# Altium footprint library Gate Driver Board.PcbLib: 117 footprints (part 3 of 8)
Each footprint in its own frame and in the unit in brackets; x right, y up, seen from the top. Pads: shape width x height; smd on the part's side, far side on the other; paste and mask are expansions set on the pad; w line width, h text height; cw(c..) or ccw(c..) is an arc to the next point about the centre after c.
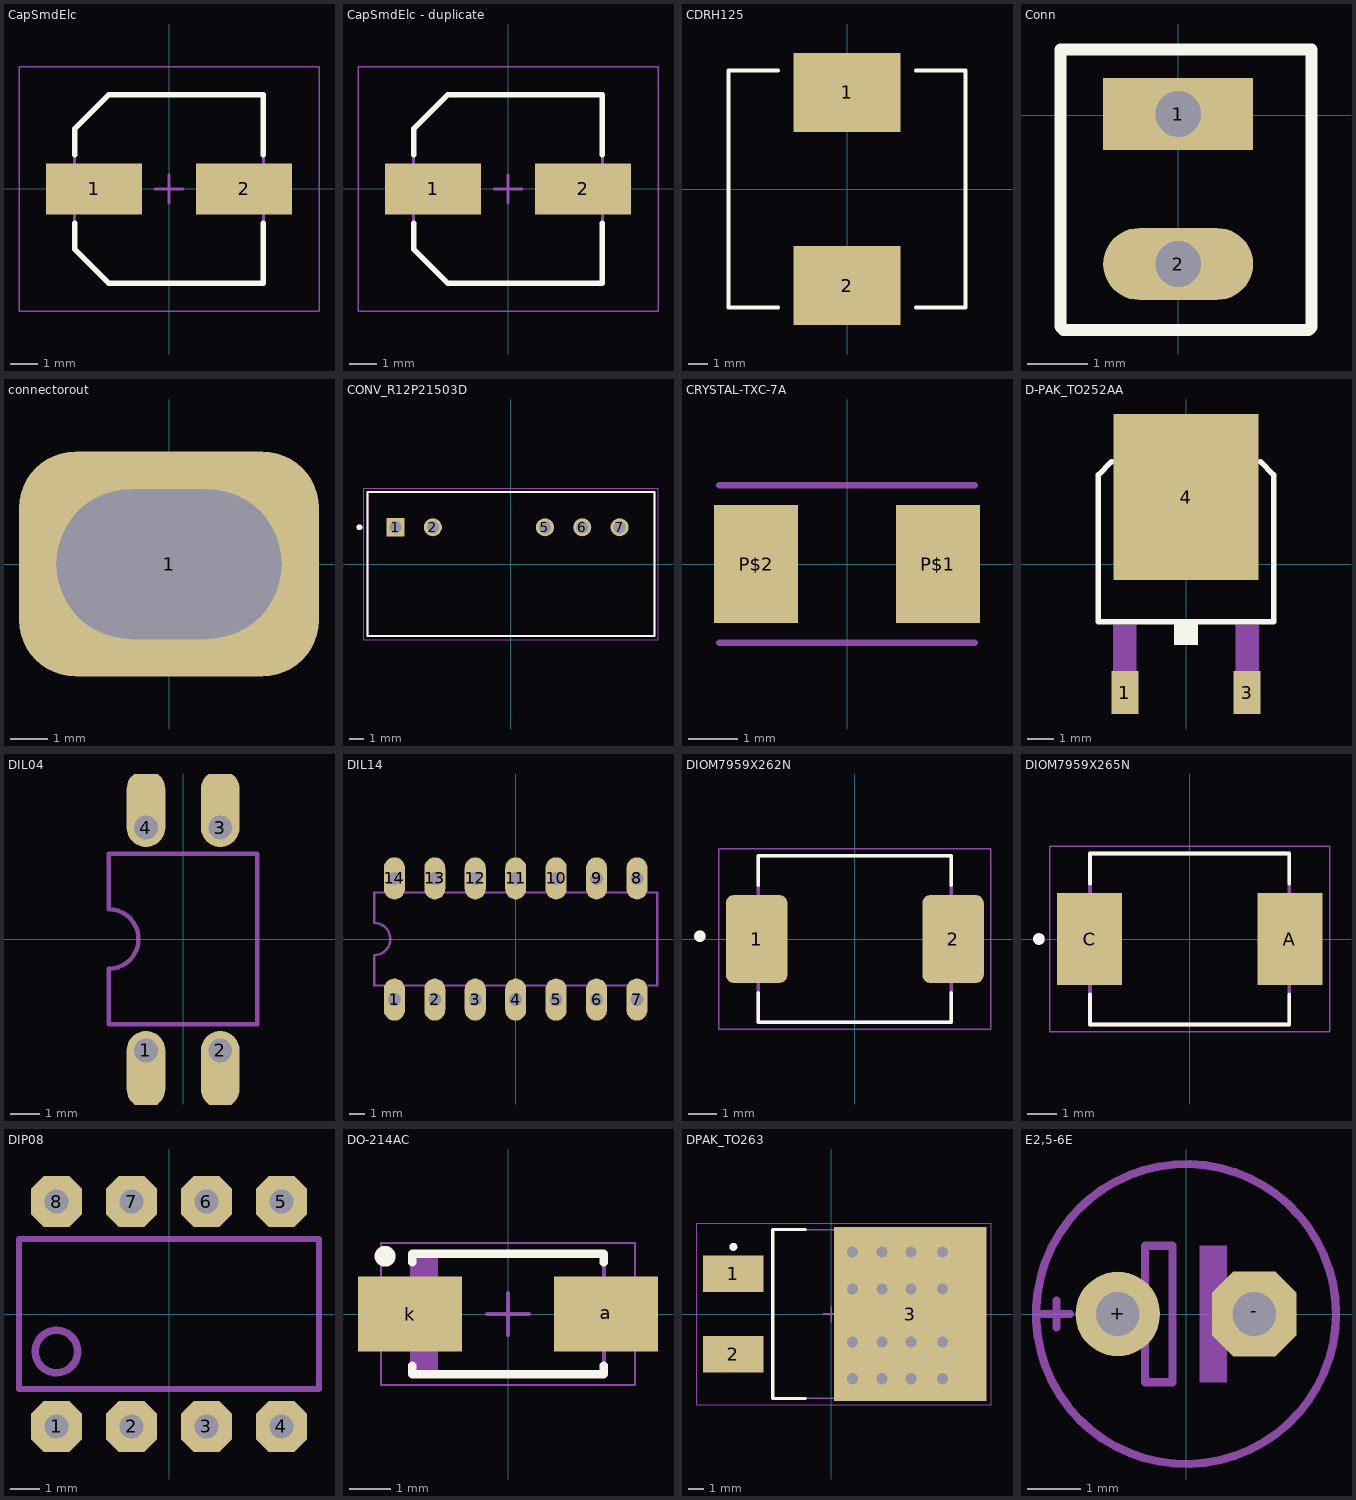
[diagram p2: the footprints below, top view; thin cyan lines are the x and y axes]

## CapSmdElc [mm] "Aluminum Electrolytic Capacitor, Body 6.70x6.70x6.30mm, IPC Low Density"
height 6.3
pads (2):
  rect 3.45x1.85 smd: 1(-2.7,0) 2(2.7,0)
Top Overlay:
  lines w0.2: -3.4,-1.225 -3.4,-2.163 -2.163,-3.4 3.4,-3.4 3.4,-1.225 ; -3.4,1.225 -3.4,2.163 -2.163,3.4 3.4,3.4 3.4,1.225
Assembly Top:
  lines w0.1: -3.4,-2.163 -3.4,2.163 -2.163,3.4 3.4,3.4 3.4,-3.4 -2.163,-3.4 -3.4,-2.163
Courtyard Top:
  lines w0.05: -5.4,-4.4 5.4,-4.4 5.4,4.4 -5.4,4.4 -5.4,-4.4
  lines w0.1: -0.5,0 0.5,0 ; 0,-0.5 0,0.5
3D body "User Library-Nichicon_CW6_3x7.STEP": height 6.92, standoff 0.01, extent -3.45,-3.275 3.55,3.325

## CapSmdElc - duplicate [mm] "Aluminum Electrolytic Capacitor, Body 6.70x6.70x6.30mm, IPC Low Density"
height 6.3
pads (2):
  rect 3.45x1.85 smd: 1(-2.7,0) 2(2.7,0)
Top Overlay:
  lines w0.2: -3.4,-1.225 -3.4,-2.163 -2.163,-3.4 3.4,-3.4 3.4,-1.225 ; -3.4,1.225 -3.4,2.163 -2.163,3.4 3.4,3.4 3.4,1.225
Assembly Top:
  lines w0.1: -3.4,-2.163 -3.4,2.163 -2.163,3.4 3.4,3.4 3.4,-3.4 -2.163,-3.4 -3.4,-2.163
Courtyard Top:
  lines w0.05: -5.4,-4.4 5.4,-4.4 5.4,4.4 -5.4,4.4 -5.4,-4.4
  lines w0.1: -0.5,0 0.5,0 ; 0,-0.5 0,0.5
3D body "User Library-Nichicon_CW6_3x7.STEP": height 6.92, standoff 0.01, extent -3.45,-3.275 3.55,3.325

## CDRH125 [mm] "CDRH125"
pads (2):
  rect 5.4x4 smd: 1(0,4.9) 2(0,-4.9)
Top Overlay:
  lines w0.203: -3.5,-6 -6,-6 -6,6 -3.5,6 ; 3.5,-6 6,-6 6,6 3.5,6

## Conn [mm]
pads (2):
  rect 2.5x1.2 hole 0.762 square: 1(0,0.025)
  oval 2.5x1.2 hole 0.762 square: 2(0,-2.475)
Top Overlay:
  lines w0.2: -1.965,-3.52 -1.91,-3.575 2.175,-3.575 2.225,-3.525 2.225,1.1 -1.965,1.1 -1.965,-3.52
3D body "User Library-Header1x2.STEP": height 8.15, standoff -2.83, extent -1.24,-3.74 1.3,1.34

## connectorout [mm]
pads (1):
  rrect50% 8x6 hole 4 slot 6 at 0 deg: 1(0,0)

## CONV_R12P21503D [mm]
pads (5):
  rect 1.23x1.23 hole 0.82: 1(-7.85,2.5)
  round 1.23 hole 0.82: 2(-5.31,2.5) 5(2.31,2.5) 6(4.85,2.5) 7(7.39,2.5)
Top Overlay:
  circle w0.2: c-10.3,2.5 r0.1
  lines w0.127: -9.75,-4.9 -9.75,4.9 9.75,4.9 9.75,-4.9 -9.75,-4.9
Mechanical 13:
  circle w0.2: c-10.3,2.5 r0.1
  lines w0.127: -9.75,-4.9 9.75,-4.9 9.75,4.9 -9.75,4.9 -9.75,-4.9
Mechanical 15:
  lines w0.05: -10,-5.15 -10,5.15 10,5.15 10,-5.15 -10,-5.15
3D body "R12P21503D.STEP": height 12, standoff -4.6, extent -9.75,-4.9 9.75,4.9

## CRYSTAL-TXC-7A [mm] "CRYSTAL-TXC-7A"
pads (2):
  rect 1.7x2.4 smd: P$1(1.85,0) P$2(-1.85,0)
3D Body Bottom:
  lines w0.127: -2.6,-1.6 2.6,-1.6 ; -2.6,1.6 2.6,1.6

## D-PAK_TO252AA [mm] "D-PAK_TO252AA"
pads (3):
  rect 1x1.6 smd: 1(-2.28,-4.8) 3(2.28,-4.8)
  rect 5.4x6.2 smd: 4(0,2.5)
Top Overlay:
  region: -0.432,-3.023 -0.432,-2.261 0.432,-2.261 0.432,-3.023
  lines w0.203: -2.775,3.825 -3.275,3.325 -3.275,-2.15 3.275,-2.15 3.275,3.325 2.775,3.825
Assembly Bottom:
  region: -2.718,-5.156 -2.718,-2.261 -1.854,-2.261 -1.854,-5.156
  region: 1.854,-5.156 1.854,-2.261 2.718,-2.261 2.718,-5.156
  region: -2.565,3.937 -2.565,4.648 -2.108,5.105 2.108,5.105 2.565,4.648 2.565,3.937
  lines w0.203: -2.565,3.937 -2.565,4.648 -2.108,5.105 2.108,5.105 2.565,4.648 2.565,3.937 -2.565,3.937
3D body "TO252 Gehäuse.step": height 2.3, standoff -0.05, extent -3.35,-4.825 3.15,3.875

## DIL04 [mil] "DIL04"
pads (4):
  oval 52x104 / inner round 0 / far side oval 52x104 hole 32 copper offset 0,-26: 1(-50,-150) 2(50,-150)
  oval 52x104 / inner round 0 / far side oval 52x104 hole 32 copper offset 0,26: 3(50,150) 4(-50,150)
3D Body Bottom:
  lines w6: -100,-115 -100,-40 ccw(c-100,0) -100,40 -100,115 100,115 100,-115 -100,-115
3D body: height 50, standoff 0, extent -76.22,123.78 -23.78,228.22
3D body: height 50, standoff 0, extent 23.78,123.78 76.22,228.22
3D body: height 50, standoff 0, extent 23.78,-228.22 76.22,-123.78
3D body: height 50, standoff 0, extent -76.22,-228.22 -23.78,-123.78

## DIL14 [mil] "DIL14"
pads (14):
  oval 52x104 / inner round 0 / far side oval 52x104 hole 32: 1(-300,-150) 2(-200,-150) 3(-100,-150) 4(0,-150) 5(100,-150) 6(200,-150) 7(300,-150) 8(300,150) 9(200,150) 10(100,150) 11(0,150) 12(-100,150) 13(-200,150) 14(-300,150)
3D Body Bottom:
  lines w6: -350,-115 350,-115 350,115 -350,115 -350,40 cw(c-350,0) -350,-40 -350,-115
3D body: height 50, standoff 0, extent -326.22,-202.22 -273.78,-97.78
3D body: height 50, standoff 0, extent -226.22,-202.22 -173.78,-97.78
3D body: height 50, standoff 0, extent 273.78,-202.22 326.22,-97.78
3D body: height 50, standoff 0, extent 273.78,97.78 326.22,202.22
3D body: height 50, standoff 0, extent -126.22,-202.22 -73.78,-97.78
3D body: height 50, standoff 0, extent -26.22,-202.22 26.22,-97.78
3D body: height 50, standoff 0, extent 173.78,-202.22 226.22,-97.78
3D body: height 50, standoff 0, extent 73.78,-202.22 126.22,-97.78
3D body: height 50, standoff 0, extent 173.78,97.78 226.22,202.22
3D body: height 50, standoff 0, extent 73.78,97.78 126.22,202.22
3D body: height 50, standoff 0, extent -26.22,97.78 26.22,202.22
3D body: height 50, standoff 0, extent -126.22,97.78 -73.78,202.22
3D body: height 50, standoff 0, extent -226.22,97.78 -173.78,202.22
3D body: height 50, standoff 0, extent -326.22,97.78 -273.78,202.22

## DIOM7959X262N [mm]
pads (2):
  rrect25% 2.18x3.12 smd: 1(-3.485,0) 2(3.485,0)
Top Overlay:
  circle w0.2: c-5.5,0.1 r0.1
  lines w0.127: -3.427,-1.9 -3.427,-2.953 3.427,-2.953 3.427,-1.9 ; -3.427,1.9 -3.427,2.953 3.427,2.953 3.427,1.9
Mechanical 13:
  circle w0.2: c-5.5,0.1 r0.1
  lines w0.127: -3.427,-2.953 -3.427,2.953 3.427,2.953 3.427,-2.953 -3.427,-2.953
Mechanical 15:
  lines w0.05: -4.825,-3.203 -4.825,3.203 4.825,3.203 4.825,-3.203 -4.825,-3.203
3D body "SMCJ300CA.STEP": height 2.71, standoff 0.09, extent -3.964,-2.963 3.974,2.943

## DIOM7959X265N [mm]
pads (2):
  rect 2.25x3.18 smd: A(3.455,0) C(-3.455,0)
Top Overlay:
  circle w0.2: c-5.2,0 r0.1
  lines w0.127: -3.437,-1.91 -3.437,-2.95 3.437,-2.95 3.437,-1.91 ; -3.437,1.91 -3.437,2.95 3.437,2.95 3.437,1.91
Mechanical 13:
  circle w0.2: c-5.2,0 r0.1
  lines w0.127: -3.437,-2.95 3.437,-2.95 3.437,2.95 -3.437,2.95 -3.437,-2.95
Mechanical 15:
  lines w0.05: -4.83,-3.2 -4.83,3.2 4.83,3.2 4.83,-3.2 -4.83,-3.2
3D body "SK54.STEP": height 2.62, standoff 0, extent -4.097,-2.952 3.843,2.952

## DIP08 [mil] "DIP08"
pads (8):
  oct 68x68 / inner round 0 / far side oct 68x68 hole 32: 1(-150,-150) 2(-50,-150) 3(50,-150) 4(150,-150) 5(150,150) 6(50,150) 7(-50,150) 8(-150,150)
3D Body Bottom:
  circle w10: c-150,-50 r28.28
  lines w8: -200,-40 -200,-60 ; -200,-60 -200,-100 200,-100 200,100 -200,100 -200,-60
3D body: height 50, standoff 0, extent -181.68,118.32 -118.32,181.68
3D body: height 50, standoff 0, extent -81.68,118.32 -18.32,181.68
3D body: height 50, standoff 0, extent 18.32,118.32 81.68,181.68
3D body: height 50, standoff 0, extent 118.32,118.32 181.68,181.68
3D body: height 50, standoff 0, extent 118.32,-181.68 181.68,-118.32
3D body: height 50, standoff 0, extent 18.32,-181.68 81.68,-118.32
3D body: height 50, standoff 0, extent -81.68,-181.68 -18.32,-118.32
3D body: height 50, standoff 0, extent -181.68,-181.68 -118.32,-118.32

## DO-214AC [mm]
height 1.35
pads (2):
  rect 2.5x1.8 smd: a(2.35,0) k(-2.35,0)
Top Overlay:
  circle w0.25: c-2.95,1.385 r0.125
  lines w0.2: -2.3,-1.235 -2.3,-1.45 2.3,-1.45 2.3,-1.235 ; -2.3,1.235 -2.3,1.45 2.3,1.45 2.3,1.235
Assembly Top:
  rectangle: -2.3,-1.45 -1.681,1.45
  lines w0.1: -2.3,-1.45 2.3,-1.45 2.3,1.45 -2.3,1.45 -2.3,-1.45
Courtyard Top:
  lines w0.05: -3.05,-1.7 3.05,-1.7 3.05,1.7 -3.05,1.7 -3.05,-1.7
  lines w0.1: -0.5,0 0.5,0 ; 0,-0.5 0,0.5
3D body "User Library-DO-214AC(SMA).STEP": height 2.3, standoff 0.01, extent -2.768,-1.422 2.718,1.372

## DPAK_TO263 [mm] "D2-PAK, 3-Pads, Body 7.93x8.70mm (max), IPC Medium Density"
height 4.8
pads (3):
  rect 3.81x2.32 smd: 1(-6.2,2.54) 2(-6.2,-2.54)
  rect 9.65x11 smd: 3(5,0)
via 7.05,-4.1 diameter 1.27 hole 0.711
via 5.05,-4.1 diameter 1.27 hole 0.711
via 3.225,-4.1 diameter 1.27 hole 0.711
via 1.35,-4.1 diameter 1.27 hole 0.711
via 7.05,-1.775 diameter 1.27 hole 0.711
via 5.05,-1.775 diameter 1.27 hole 0.711
via 3.225,-1.775 diameter 1.27 hole 0.711
via 1.35,-1.775 diameter 1.27 hole 0.711
via 7.05,1.575 diameter 1.27 hole 0.711
via 5.05,1.575 diameter 1.27 hole 0.711
via 3.225,1.575 diameter 1.27 hole 0.711
via 1.35,1.575 diameter 1.27 hole 0.711
via 7.05,3.925 diameter 1.27 hole 0.711
via 5.05,3.925 diameter 1.27 hole 0.711
via 3.225,3.925 diameter 1.27 hole 0.711
via 1.35,3.925 diameter 1.27 hole 0.711
Top Overlay:
  circle w0.25: c-6.2,4.25 r0.125
  lines w0.2: -1.625,-5.35 -3.7,-5.35 -3.7,5.35 -1.625,5.35
Assembly Top:
  lines w0.1: -3.7,-5.325 -3.7,5.325 5.95,5.325 5.95,-5.325 -3.7,-5.325
Courtyard Top:
  lines w0.05: -8.5,-5.75 -8.5,5.75 10.125,5.75 10.125,-5.75 -8.5,-5.75
  lines w0.1: -0.5,0 0.5,0 ; 0,-0.5 0,0.5
3D body "User Library-TO263-3S.STEP": height 4.81, standoff 0.01, extent -7.515,-4.975 8.155,5.025

## E2,5-6E [mil] "E2,5-6E"
pads (2):
  round 62 / inner round 0 / far side round 62 hole 32: +(-50,0)
  oct 62x62 / inner round 0 / far side oct 62x62 hole 32: -(50,0)
Assembly Bottom:
  region: 10,-50 10,50 30,50 30,-50
  lines w6: -65,0 -30,0 ; 25,0 65,0 ; -30,0 -30,-50 -10,-50 -10,50 -30,50 -30,0
3D Body Bottom:
  circle w6: c0,0 r110
  lines w6: -105,0 -85,0 ; -95,-10 -95,10
3D body: height 150, standoff 0, extent -68.25,-3.25 -26.75,3.25
3D body: height 150, standoff 0, extent -33.25,-53.25 -26.75,3.25
3D body: height 150, standoff 0, extent -33.25,-53.25 -6.75,-46.75
3D body: height 150, standoff 0, extent -13.25,-53.25 -6.75,53.25
3D body: height 150, standoff 0, extent -33.25,46.75 -6.75,53.25
3D body: height 150, standoff 0, extent -33.25,-3.25 -26.75,53.25
3D body: height 150, standoff 0, extent 21.75,-3.25 68.25,3.25
3D body: height 150, standoff 0, extent 10,-50 30,50
3D body: height 50, standoff 0, extent 21.11,-28.89 78.89,28.89
3D body: height 50, standoff 0, extent -81.27,-31.27 -18.73,31.27